# Altium schematic symbol library Resistor - Current Sense.SchLib: 810 symbols (part 1 of 4) (continued)
## CSNL2512FTL500 (continued)
RES SMD 0.0005 OHM 1% 2W 2512; Manufacturer: Stackpole Electronics Inc.; Value: 0.0005; TemperatureRange: -55C ~ 170C; TemperatureCoefficient: 50ppm/C; Part Number: CSNL2512FTL500; PartId: 21422; Supplier 1: Digi-Key; Supplier Part Number 1: CSNL2512FTL500TR-ND; ComponentLink1Description: Datasheet; ComponentLink1URL: https://www.seielect.com/Catalog/SEI-csnl.pdf; ComponentLink2Description: Digi-Key Listing; ComponentLink2URL: https://www.digikey.com/product-detail/en/stackpole-electronics-inc/CSNL2512FTL500/CSNL2512FTL500TR-ND/1788105; Tolerance: 1%; PowerRating: 2W; Price: 0.2261; Device Package: 2512 (6432 Metric)
footprint STACKPOLE CSR2512
pins: 1, 2

## CSR0402FK1R00
designator R?, comment 1
RES SMD 1 OHM 1% 1/8W 0402; Part Number: CSR0402FK1R00; Manufacturer: Stackpole Electronics Inc.; TemperatureRange: -55C ~ 155C; TemperatureCoefficient: 200ppm/C; PowerRating: 0.125W, 1/8W; Value: 1; PartId: 9835; Supplier 1: Digi-Key; Supplier Part Number 1: CSR0402FK1R00TR-ND; ComponentLink1Description: Datasheet; ComponentLink1URL: http://www.seielect.com/catalog/SEI-CSR_CSRN.pdf; ComponentLink2Description: Digi-Key Listing; ComponentLink2URL: https://www.digikey.com/product-detail/en/stackpole-electronics-inc/CSR0402FK1R00/CSR0402FK1R00TR-ND/1742501; Tolerance: 1%; Price: 0.036; Device Package: 0402 (1005 Metric)
footprint STACKPOLE CSR0402
pins: 1, 2

## CSR0402FK50L0
designator R?, comment 0.05
RES SMD 0.05 OHM 1% 1/8W 0402; Part Number: CSR0402FK50L0; Manufacturer: Stackpole Electronics Inc.; TemperatureRange: -55C ~ 155C; TemperatureCoefficient: 200ppm/C; PowerRating: 0.125W, 1/8W; Value: 0.05; PartId: 9834; Supplier 1: Digi-Key; Supplier Part Number 1: CSR0402FK50L0TR-ND; ComponentLink1Description: Datasheet; ComponentLink1URL: http://www.seielect.com/catalog/SEI-CSR_CSRN.pdf; ComponentLink2Description: Digi-Key Listing; ComponentLink2URL: https://www.digikey.com/product-detail/en/stackpole-electronics-inc/CSR0402FK50L0/CSR0402FK50L0TR-ND/5251277; Tolerance: 1%; Price: 0.08; Device Package: 0402 (1005 Metric)
footprint STACKPOLE CSR0402
pins: 1, 2

## CSR0402FK51L0
designator R?, comment 0.051
RES SMD 0.051 OHM 1% 1/8W 0402; Part Number: CSR0402FK51L0; Manufacturer: Stackpole Electronics Inc.; TemperatureRange: -55C ~ 155C; TemperatureCoefficient: 200ppm/C; PowerRating: 0.125W, 1/8W; Value: 0.051; PartId: 9843; Supplier 1: Digi-Key; Supplier Part Number 1: CSR0402FK51L0-ND; ComponentLink1Description: Datasheet; ComponentLink1URL: http://www.seielect.com/catalog/SEI-CSR_CSRN.pdf; ComponentLink2Description: Digi-Key Listing; ComponentLink2URL: https://www.digikey.com/product-detail/en/stackpole-electronics-inc/CSR0402FK51L0/CSR0402FK51L0-ND/1742495; Tolerance: 1%; Price: 0.08; Device Package: 0402 (1005 Metric)
footprint STACKPOLE CSR0402
pins: 1, 2

## CSR0402FK75L0
designator R?, comment 0.075
RES SMD 0.075 OHM 1% 1/8W 0402; Part Number: CSR0402FK75L0; Manufacturer: Stackpole Electronics Inc.; TemperatureRange: -55C ~ 155C; TemperatureCoefficient: 200ppm/C; PowerRating: 0.125W, 1/8W; Value: 0.075; PartId: 9833; Supplier 1: Digi-Key; Supplier Part Number 1: CSR0402FK75L0TR-ND; ComponentLink1Description: Datasheet; ComponentLink1URL: http://www.seielect.com/catalog/SEI-CSR_CSRN.pdf; ComponentLink2Description: Digi-Key Listing; ComponentLink2URL: https://www.digikey.com/product-detail/en/stackpole-electronics-inc/CSR0402FK75L0/CSR0402FK75L0TR-ND/5251278; Tolerance: 1%; Price: 0.08; Device Package: 0402 (1005 Metric)
footprint STACKPOLE CSR0402
pins: 1, 2

## CSR0402FKR100
designator R?, comment 0.1
RES SMD 0.1 OHM 1% 1/8W 0402; Part Number: CSR0402FKR100; Manufacturer: Stackpole Electronics Inc.; TemperatureRange: -55C ~ 155C; TemperatureCoefficient: 200ppm/C; PowerRating: 0.125W, 1/8W; Value: 0.1; PartId: 9838; Supplier 1: Digi-Key; Supplier Part Number 1: CSR0402FKR100TR-ND; ComponentLink1Description: Datasheet; ComponentLink1URL: http://www.seielect.com/catalog/SEI-CSR_CSRN.pdf; ComponentLink2Description: Digi-Key Listing; ComponentLink2URL: https://www.digikey.com/product-detail/en/stackpole-electronics-inc/CSR0402FKR100/CSR0402FKR100TR-ND/1742496; Tolerance: 1%; Price: 0.064; Device Package: 0402 (1005 Metric)
footprint STACKPOLE CSR0402
pins: 1, 2

## CSR0402FKR130
designator R?, comment 0.13
RES SMD 0.13 OHM 1% 1/8W 0402; Part Number: CSR0402FKR130; Manufacturer: Stackpole Electronics Inc.; TemperatureRange: -55C ~ 155C; TemperatureCoefficient: 200ppm/C; PowerRating: 0.125W, 1/8W; Value: 0.13; PartId: 9841; Supplier 1: Digi-Key; Supplier Part Number 1: CSR0402FKR130-ND; ComponentLink1Description: Datasheet; ComponentLink1URL: http://www.seielect.com/catalog/SEI-CSR_CSRN.pdf; ComponentLink2Description: Digi-Key Listing; ComponentLink2URL: https://www.digikey.com/product-detail/en/stackpole-electronics-inc/CSR0402FKR130/CSR0402FKR130-ND/1742498; Tolerance: 1%; Price: 0.036; Device Package: 0402 (1005 Metric)
footprint STACKPOLE CSR0402
pins: 1, 2

## CSR0402FKR200
designator R?, comment 0.2
RES SMD 0.2 OHM 1% 1/8W 0402; Part Number: CSR0402FKR200; Manufacturer: Stackpole Electronics Inc.; TemperatureRange: -55C ~ 155C; TemperatureCoefficient: 200ppm/C; PowerRating: 0.125W, 1/8W; Value: 0.2; PartId: 9832; Supplier 1: Digi-Key; Supplier Part Number 1: CSR0402FKR200TR-ND; ComponentLink1Description: Datasheet; ComponentLink1URL: http://www.seielect.com/catalog/SEI-CSR_CSRN.pdf; ComponentLink2Description: Digi-Key Listing; ComponentLink2URL: https://www.digikey.com/product-detail/en/stackpole-electronics-inc/CSR0402FKR200/CSR0402FKR200TR-ND/5251279; Tolerance: 1%; Price: 0.064; Device Package: 0402 (1005 Metric)
footprint STACKPOLE CSR0402
pins: 1, 2

## CSR0402FKR250
designator R?, comment 0.25
RES SMD 0.25 OHM 1% 1/8W 0402; Part Number: CSR0402FKR250; Manufacturer: Stackpole Electronics Inc.; TemperatureRange: -55C ~ 155C; TemperatureCoefficient: 200ppm/C; PowerRating: 0.125W, 1/8W; Value: 0.25; PartId: 9836; Supplier 1: Digi-Key; Supplier Part Number 1: CSR0402FKR250TR-ND; ComponentLink1Description: Datasheet; ComponentLink1URL: http://www.seielect.com/catalog/SEI-CSR_CSRN.pdf; ComponentLink2Description: Digi-Key Listing; ComponentLink2URL: https://www.digikey.com/product-detail/en/stackpole-electronics-inc/CSR0402FKR250/CSR0402FKR250TR-ND/5251280; Tolerance: 1%; Price: 0.064; Device Package: 0402 (1005 Metric)
footprint STACKPOLE CSR0402
pins: 1, 2

## CSR0402FKR300
designator R?, comment 0.3
RES SMD 0.3 OHM 1% 1/8W 0402; Part Number: CSR0402FKR300; Manufacturer: Stackpole Electronics Inc.; TemperatureRange: -55C ~ 155C; TemperatureCoefficient: 200ppm/C; PowerRating: 0.125W, 1/8W; Value: 0.3; PartId: 9831; Supplier 1: Digi-Key; Supplier Part Number 1: CSR0402FKR300TR-ND; ComponentLink1Description: Datasheet; ComponentLink1URL: http://www.seielect.com/catalog/SEI-CSR_CSRN.pdf; ComponentLink2Description: Digi-Key Listing; ComponentLink2URL: https://www.digikey.com/product-detail/en/stackpole-electronics-inc/CSR0402FKR300/CSR0402FKR300TR-ND/5251281; Tolerance: 1%; Price: 0.064; Device Package: 0402 (1005 Metric)
footprint STACKPOLE CSR0402
pins: 1, 2

## CSR0402FKR500
designator R?, comment 0.5
RES SMD 0.5 OHM 1% 1/8W 0402; Part Number: CSR0402FKR500; Manufacturer: Stackpole Electronics Inc.; TemperatureRange: -55C ~ 155C; TemperatureCoefficient: 200ppm/C; PowerRating: 0.125W, 1/8W; Value: 0.5; PartId: 9837; Supplier 1: Digi-Key; Supplier Part Number 1: CSR0402FKR500TR-ND; ComponentLink1Description: Datasheet; ComponentLink1URL: http://www.seielect.com/catalog/SEI-CSR_CSRN.pdf; ComponentLink2Description: Digi-Key Listing; ComponentLink2URL: https://www.digikey.com/product-detail/en/stackpole-electronics-inc/CSR0402FKR500/CSR0402FKR500TR-ND/5251282; Tolerance: 1%; Price: 0.036; Device Package: 0402 (1005 Metric)
footprint STACKPOLE CSR0402
pins: 1, 2

## CSR0402FTR100
designator R?, comment 0.1
RES SMD 0.1 OHM 1% 1/8W 0402; Part Number: CSR0402FTR100; Manufacturer: Stackpole Electronics Inc.; TemperatureRange: -55C ~ 155C; TemperatureCoefficient: 200ppm/C; PowerRating: 0.125W, 1/8W; Value: 0.1; PartId: 9842; Supplier 1: Digi-Key; Supplier Part Number 1: CSR0402FTR100-ND; ComponentLink1Description: Datasheet; ComponentLink1URL: http://www.seielect.com/catalog/SEI-CSR_CSRN.pdf; ComponentLink2Description: Digi-Key Listing; ComponentLink2URL: https://www.digikey.com/product-detail/en/stackpole-electronics-inc/CSR0402FTR100/CSR0402FTR100-ND/1742497; Tolerance: 1%; Price: 0.066; Device Package: 0402 (1005 Metric)
footprint STACKPOLE CSR0402
pins: 1, 2

## CSR0402FTR510
designator R?, comment 0.51
RES SMD 0.51 OHM 1% 1/8W 0402; Part Number: CSR0402FTR510; Manufacturer: Stackpole Electronics Inc.; TemperatureRange: -55C ~ 155C; TemperatureCoefficient: 200ppm/C; PowerRating: 0.125W, 1/8W; Value: 0.51; PartId: 9840; Supplier 1: Digi-Key; Supplier Part Number 1: CSR0402FTR510-ND; ComponentLink1Description: Datasheet; ComponentLink1URL: http://www.seielect.com/catalog/SEI-CSR_CSRN.pdf; ComponentLink2Description: Digi-Key Listing; ComponentLink2URL: https://www.digikey.com/product-detail/en/stackpole-electronics-inc/CSR0402FTR510/CSR0402FTR510-ND/1742500; Tolerance: 1%; Price: 0.028; Device Package: 0402 (1005 Metric)
footprint STACKPOLE CSR0402
pins: 1, 2

## CSR0402JKR500
designator R?, comment 0.5
RES SMD 0.5 OHM 5% 1/8W 0402; Part Number: CSR0402JKR500; Manufacturer: Stackpole Electronics Inc.; TemperatureRange: -55C ~ 155C; TemperatureCoefficient: 200ppm/C; PowerRating: 0.125W, 1/8W; Value: 0.5; PartId: 9839; Supplier 1: Digi-Key; Supplier Part Number 1: CSR0402JKR500-ND; ComponentLink1Description: Datasheet; ComponentLink1URL: http://www.seielect.com/catalog/SEI-CSR_CSRN.pdf; ComponentLink2Description: Digi-Key Listing; ComponentLink2URL: https://www.digikey.com/product-detail/en/stackpole-electronics-inc/CSR0402JKR500/CSR0402JKR500-ND/1742499; Tolerance: 5%; Price: 0.027; Device Package: 0402 (1005 Metric)
footprint STACKPOLE CSR0402
pins: 1, 2

## CSR0603FK1R00
designator R?, comment 1
RES SMD 1 OHM 1% 1/8W 0603; Part Number: CSR0603FK1R00; Manufacturer: Stackpole Electronics Inc.; TemperatureRange: -55C ~ 155C; TemperatureCoefficient: 300ppm/C; PowerRating: 0.125W, 1/8W; Value: 1; PartId: 9854; Supplier 1: Digi-Key; Supplier Part Number 1: CSR0603FK1R00TR-ND; ComponentLink1Description: Datasheet; ComponentLink1URL: http://www.seielect.com/catalog/SEI-CSR_CSRN.pdf; ComponentLink2Description: Digi-Key Listing; ComponentLink2URL: https://www.digikey.com/product-detail/en/stackpole-electronics-inc/CSR0603FK1R00/CSR0603FK1R00TR-ND/2217462; Tolerance: 1%; Price: 0.036; Device Package: 0603 (1608 Metric)
footprint STACKPOLE CSR0603
pins: 1, 2

## CSR0603FK20L0
designator R?, comment 0.02
RES SMD 0.02 OHM 1% 1/8W 0603; Part Number: CSR0603FK20L0; Manufacturer: Stackpole Electronics Inc.; TemperatureRange: -55C ~ 155C; TemperatureCoefficient: 300ppm/C; PowerRating: 0.125W, 1/8W; Value: 0.02; PartId: 9853; Supplier 1: Digi-Key; Supplier Part Number 1: CSR0603FK20L0TR-ND; ComponentLink1Description: Datasheet; ComponentLink1URL: http://www.seielect.com/catalog/SEI-CSR_CSRN.pdf; ComponentLink2Description: Digi-Key Listing; ComponentLink2URL: https://www.digikey.com/product-detail/en/stackpole-electronics-inc/CSR0603FK20L0/CSR0603FK20L0TR-ND/1742472; Tolerance: 1%; Price: 0.112; Device Package: 0603 (1608 Metric)
footprint STACKPOLE CSR0603
pins: 1, 2

## CSR0603FK25L0
designator R?, comment 0.025
RES SMD 0.025 OHM 1% 1/8W 0603; Part Number: CSR0603FK25L0; Manufacturer: Stackpole Electronics Inc.; TemperatureRange: -55C ~ 155C; TemperatureCoefficient: 300ppm/C; PowerRating: 0.125W, 1/8W; Value: 0.025; PartId: 9849; Supplier 1: Digi-Key; Supplier Part Number 1: CSR0603FK25L0TR-ND; ComponentLink1Description: Datasheet; ComponentLink1URL: http://www.seielect.com/catalog/SEI-CSR_CSRN.pdf; ComponentLink2Description: Digi-Key Listing; ComponentLink2URL: https://www.digikey.com/product-detail/en/stackpole-electronics-inc/CSR0603FK25L0/CSR0603FK25L0TR-ND/1742473; Tolerance: 1%; Price: 0.112; Device Package: 0603 (1608 Metric)
footprint STACKPOLE CSR0603
pins: 1, 2

## CSR0603FK30L0
designator R?, comment 0.03
RES SMD 0.03 OHM 1% 1/8W 0603; Part Number: CSR0603FK30L0; Manufacturer: Stackpole Electronics Inc.; TemperatureRange: -55C ~ 155C; TemperatureCoefficient: 300ppm/C; PowerRating: 0.125W, 1/8W; Value: 0.03; PartId: 9850; Supplier 1: Digi-Key; Supplier Part Number 1: CSR0603FK30L0TR-ND; ComponentLink1Description: Datasheet; ComponentLink1URL: http://www.seielect.com/catalog/SEI-CSR_CSRN.pdf; ComponentLink2Description: Digi-Key Listing; ComponentLink2URL: https://www.digikey.com/product-detail/en/stackpole-electronics-inc/CSR0603FK30L0/CSR0603FK30L0TR-ND/2217457; Tolerance: 1%; Price: 0.112; Device Package: 0603 (1608 Metric)
footprint STACKPOLE CSR0603
pins: 1, 2

## CSR0603FK50L0
designator R?, comment 0.05
RES SMD 0.05 OHM 1% 1/8W 0603; Part Number: CSR0603FK50L0; Manufacturer: Stackpole Electronics Inc.; TemperatureRange: -55C ~ 155C; TemperatureCoefficient: 300ppm/C; PowerRating: 0.125W, 1/8W; Value: 0.05; PartId: 9848; Supplier 1: Digi-Key; Supplier Part Number 1: CSR0603FK50L0TR-ND; ComponentLink1Description: Datasheet; ComponentLink1URL: http://www.seielect.com/catalog/SEI-CSR_CSRN.pdf; ComponentLink2Description: Digi-Key Listing; ComponentLink2URL: https://www.digikey.com/product-detail/en/stackpole-electronics-inc/CSR0603FK50L0/CSR0603FK50L0TR-ND/2217458; Tolerance: 1%; Price: 0.096; Device Package: 0603 (1608 Metric)
footprint STACKPOLE CSR0603
pins: 1, 2

## CSR0603FK75L0
designator R?, comment 0.075
RES SMD 0.075 OHM 1% 1/8W 0603; Part Number: CSR0603FK75L0; Manufacturer: Stackpole Electronics Inc.; TemperatureRange: -55C ~ 155C; TemperatureCoefficient: 300ppm/C; PowerRating: 0.125W, 1/8W; Value: 0.075; PartId: 9851; Supplier 1: Digi-Key; Supplier Part Number 1: CSR0603FK75L0TR-ND; ComponentLink1Description: Datasheet; ComponentLink1URL: http://www.seielect.com/catalog/SEI-CSR_CSRN.pdf; ComponentLink2Description: Digi-Key Listing; ComponentLink2URL: https://www.digikey.com/product-detail/en/stackpole-electronics-inc/CSR0603FK75L0/CSR0603FK75L0TR-ND/1742480; Tolerance: 1%; Price: 0.096; Device Package: 0603 (1608 Metric)
footprint STACKPOLE CSR0603
pins: 1, 2

## CSR0603FKR100
designator R?, comment 0.1
RES SMD 0.1 OHM 1% 1/8W 0603; Part Number: CSR0603FKR100; Manufacturer: Stackpole Electronics Inc.; TemperatureRange: -55C ~ 155C; TemperatureCoefficient: 300ppm/C; PowerRating: 0.125W, 1/8W; Value: 0.1; PartId: 9847; Supplier 1: Digi-Key; Supplier Part Number 1: CSR0603FKR100TR-ND; ComponentLink1Description: Datasheet; ComponentLink1URL: http://www.seielect.com/catalog/SEI-CSR_CSRN.pdf; ComponentLink2Description: Digi-Key Listing; ComponentLink2URL: https://www.digikey.com/product-detail/en/stackpole-electronics-inc/CSR0603FKR100/CSR0603FKR100TR-ND/2217459; Tolerance: 1%; Price: 0.064; Device Package: 0603 (1608 Metric)
footprint STACKPOLE CSR0603
pins: 1, 2

## CSR0603FKR150
designator R?, comment 0.15
RES SMD 0.15 OHM 1% 1/8W 0603; Part Number: CSR0603FKR150; Manufacturer: Stackpole Electronics Inc.; TemperatureRange: -55C ~ 155C; TemperatureCoefficient: 300ppm/C; PowerRating: 0.125W, 1/8W; Value: 0.15; PartId: 9866; Supplier 1: Digi-Key; Supplier Part Number 1: CSR0603FKR150-ND; ComponentLink1Description: Datasheet; ComponentLink1URL: http://www.seielect.com/catalog/SEI-CSR_CSRN.pdf; ComponentLink2Description: Digi-Key Listing; ComponentLink2URL: https://www.digikey.com/product-detail/en/stackpole-electronics-inc/CSR0603FKR150/CSR0603FKR150-ND/1742483; Tolerance: 1%; Price: 0.064; Device Package: 0603 (1608 Metric)
footprint STACKPOLE CSR0603
pins: 1, 2

## CSR0603FKR200
designator R?, comment 0.2
RES SMD 0.2 OHM 1% 1/8W 0603; Part Number: CSR0603FKR200; Manufacturer: Stackpole Electronics Inc.; TemperatureRange: -55C ~ 155C; TemperatureCoefficient: 300ppm/C; PowerRating: 0.125W, 1/8W; Value: 0.2; PartId: 9845; Supplier 1: Digi-Key; Supplier Part Number 1: CSR0603FKR200TR-ND; ComponentLink1Description: Datasheet; ComponentLink1URL: http://www.seielect.com/catalog/SEI-CSR_CSRN.pdf; ComponentLink2Description: Digi-Key Listing; ComponentLink2URL: https://www.digikey.com/product-detail/en/stackpole-electronics-inc/CSR0603FKR200/CSR0603FKR200TR-ND/1742484; Tolerance: 1%; Price: 0.064; Device Package: 0603 (1608 Metric)
footprint STACKPOLE CSR0603
pins: 1, 2

## CSR0603FKR220
designator R?, comment 0.22
RES SMD 0.22 OHM 1% 1/8W 0603; Part Number: CSR0603FKR220; Manufacturer: Stackpole Electronics Inc.; TemperatureRange: -55C ~ 155C; TemperatureCoefficient: 300ppm/C; PowerRating: 0.125W, 1/8W; Value: 0.22; PartId: 9867; Supplier 1: Digi-Key; Supplier Part Number 1: CSR0603FKR220-ND; ComponentLink1Description: Datasheet; ComponentLink1URL: http://www.seielect.com/catalog/SEI-CSR_CSRN.pdf; ComponentLink2Description: Digi-Key Listing; ComponentLink2URL: https://www.digikey.com/product-detail/en/stackpole-electronics-inc/CSR0603FKR220/CSR0603FKR220-ND/1742485; Tolerance: 1%; Price: 0.064; Device Package: 0603 (1608 Metric)
footprint STACKPOLE CSR0603
pins: 1, 2

## CSR0603FKR250
designator R?, comment 0.25
RES SMD 0.25 OHM 1% 1/8W 0603; Part Number: CSR0603FKR250; Manufacturer: Stackpole Electronics Inc.; TemperatureRange: -55C ~ 155C; TemperatureCoefficient: 300ppm/C; PowerRating: 0.125W, 1/8W; Value: 0.25; PartId: 9846; Supplier 1: Digi-Key; Supplier Part Number 1: CSR0603FKR250TR-ND; ComponentLink1Description: Datasheet; ComponentLink1URL: http://www.seielect.com/catalog/SEI-CSR_CSRN.pdf; ComponentLink2Description: Digi-Key Listing; ComponentLink2URL: https://www.digikey.com/product-detail/en/stackpole-electronics-inc/CSR0603FKR250/CSR0603FKR250TR-ND/1742486; Tolerance: 1%; Price: 0.064; Device Package: 0603 (1608 Metric)
footprint STACKPOLE CSR0603
pins: 1, 2

## CSR0603FKR300
designator R?, comment 0.3
RES SMD 0.3 OHM 1% 1/8W 0603; Part Number: CSR0603FKR300; Manufacturer: Stackpole Electronics Inc.; TemperatureRange: -55C ~ 155C; TemperatureCoefficient: 300ppm/C; PowerRating: 0.125W, 1/8W; Value: 0.3; PartId: 9852; Supplier 1: Digi-Key; Supplier Part Number 1: CSR0603FKR300TR-ND; ComponentLink1Description: Datasheet; ComponentLink1URL: http://www.seielect.com/catalog/SEI-CSR_CSRN.pdf; ComponentLink2Description: Digi-Key Listing; ComponentLink2URL: https://www.digikey.com/product-detail/en/stackpole-electronics-inc/CSR0603FKR300/CSR0603FKR300TR-ND/2217460; Tolerance: 1%; Price: 0.064; Device Package: 0603 (1608 Metric)
footprint STACKPOLE CSR0603
pins: 1, 2

## CSR0603FKR500
designator R?, comment 0.5
RES SMD 0.5 OHM 1% 1/8W 0603; Part Number: CSR0603FKR500; Manufacturer: Stackpole Electronics Inc.; TemperatureRange: -55C ~ 155C; TemperatureCoefficient: 300ppm/C; PowerRating: 0.125W, 1/8W; Value: 0.5; PartId: 9844; Supplier 1: Digi-Key; Supplier Part Number 1: CSR0603FKR500TR-ND; ComponentLink1Description: Datasheet; ComponentLink1URL: http://www.seielect.com/catalog/SEI-CSR_CSRN.pdf; ComponentLink2Description: Digi-Key Listing; ComponentLink2URL: https://www.digikey.com/product-detail/en/stackpole-electronics-inc/CSR0603FKR500/CSR0603FKR500TR-ND/2217461; Tolerance: 1%; Price: 0.036; Device Package: 0603 (1608 Metric)
footprint STACKPOLE CSR0603
pins: 1, 2

## CSR0603FKR750
designator R?, comment 0.75
RES SMD 0.75 OHM 1% 1/8W 0603; Part Number: CSR0603FKR750; Manufacturer: Stackpole Electronics Inc.; TemperatureRange: -55C ~ 155C; TemperatureCoefficient: 300ppm/C; PowerRating: 0.125W, 1/8W; Value: 0.75; PartId: 9861; Supplier 1: Digi-Key; Supplier Part Number 1: CSR0603FKR750-ND; ComponentLink1Description: Datasheet; ComponentLink1URL: http://www.seielect.com/catalog/SEI-CSR_CSRN.pdf; ComponentLink2Description: Digi-Key Listing; ComponentLink2URL: https://www.digikey.com/product-detail/en/stackpole-electronics-inc/CSR0603FKR750/CSR0603FKR750-ND/1742492; Tolerance: 1%; Price: 0.036; Device Package: 0603 (1608 Metric)
footprint STACKPOLE CSR0603
pins: 1, 2

## CSR0603FT25L0
designator R?, comment 0.025
RES SMD 0.025 OHM 1% 1/8W 0603; Part Number: CSR0603FT25L0; Manufacturer: Stackpole Electronics Inc.; TemperatureRange: -55C ~ 155C; TemperatureCoefficient: 300ppm/C; PowerRating: 0.125W, 1/8W; Value: 0.025; PartId: 9872; Supplier 1: Digi-Key; Supplier Part Number 1: CSR0603FT25L0-ND; ComponentLink1Description: Datasheet; ComponentLink1URL: http://www.seielect.com/catalog/SEI-CSR_CSRN.pdf; ComponentLink2Description: Digi-Key Listing; ComponentLink2URL: https://www.digikey.com/product-detail/en/stackpole-electronics-inc/CSR0603FT25L0/CSR0603FT25L0-ND/1742474; Tolerance: 1%; Price: 0.1064; Device Package: 0603 (1608 Metric)
footprint STACKPOLE CSR0603
pins: 1, 2

## CSR0603FT75L0
designator R?, comment 0.075
RES SMD 0.075 OHM 1% 1/8W 0603; Part Number: CSR0603FT75L0; Manufacturer: Stackpole Electronics Inc.; TemperatureRange: -55C ~ 155C; TemperatureCoefficient: 300ppm/C; PowerRating: 0.125W, 1/8W; Value: 0.075; PartId: 9869; Supplier 1: Digi-Key; Supplier Part Number 1: CSR0603FT75L0-ND; ComponentLink1Description: Datasheet; ComponentLink1URL: http://www.seielect.com/catalog/SEI-CSR_CSRN.pdf; ComponentLink2Description: Digi-Key Listing; ComponentLink2URL: https://www.digikey.com/product-detail/en/stackpole-electronics-inc/CSR0603FT75L0/CSR0603FT75L0-ND/1742481; Tolerance: 1%; Price: 0.081; Device Package: 0603 (1608 Metric)
footprint STACKPOLE CSR0603
pins: 1, 2

## CSR0603FTR250
designator R?, comment 0.25
RES SMD 0.25 OHM 1% 1/8W 0603; Part Number: CSR0603FTR250; Manufacturer: Stackpole Electronics Inc.; TemperatureRange: -55C ~ 155C; TemperatureCoefficient: 300ppm/C; PowerRating: 0.125W, 1/8W; Value: 0.25; PartId: 9863; Supplier 1: Digi-Key; Supplier Part Number 1: CSR0603FTR250-ND; ComponentLink1Description: Datasheet; ComponentLink1URL: http://www.seielect.com/catalog/SEI-CSR_CSRN.pdf; ComponentLink2Description: Digi-Key Listing; ComponentLink2URL: https://www.digikey.com/product-detail/en/stackpole-electronics-inc/CSR0603FTR250/CSR0603FTR250-ND/1742487; Tolerance: 1%; Price: 0.054; Device Package: 0603 (1608 Metric)
footprint STACKPOLE CSR0603
pins: 1, 2

## CSR0603FTR750
designator R?, comment 0.75
RES SMD 0.75 OHM 1% 1/8W 0603; Part Number: CSR0603FTR750; Manufacturer: Stackpole Electronics Inc.; TemperatureRange: -55C ~ 155C; TemperatureCoefficient: 300ppm/C; PowerRating: 0.125W, 1/8W; Value: 0.75; PartId: 9860; Supplier 1: Digi-Key; Supplier Part Number 1: CSR0603FTR750-ND; ComponentLink1Description: Datasheet; ComponentLink1URL: http://www.seielect.com/catalog/SEI-CSR_CSRN.pdf; ComponentLink2Description: Digi-Key Listing; ComponentLink2URL: https://www.digikey.com/product-detail/en/stackpole-electronics-inc/CSR0603FTR750/CSR0603FTR750-ND/1742493; Tolerance: 1%; Price: 0.03; Device Package: 0603 (1608 Metric)
footprint STACKPOLE CSR0603
pins: 1, 2

## CSR0603JK25L0
designator R?, comment 0.025
RES SMD 0.025 OHM 5% 1/8W 0603; Part Number: CSR0603JK25L0; Manufacturer: Stackpole Electronics Inc.; TemperatureRange: -55C ~ 155C; TemperatureCoefficient: 300ppm/C; PowerRating: 0.125W, 1/8W; Value: 0.025; PartId: 9870; Supplier 1: Digi-Key; Supplier Part Number 1: CSR0603JK25L0-ND; ComponentLink1Description: Datasheet; ComponentLink1URL: http://www.seielect.com/catalog/SEI-CSR_CSRN.pdf; ComponentLink2Description: Digi-Key Listing; ComponentLink2URL: https://www.digikey.com/product-detail/en/stackpole-electronics-inc/CSR0603JK25L0/CSR0603JK25L0-ND/1742475; Tolerance: 5%; Price: 0.096; Device Package: 0603 (1608 Metric)
footprint STACKPOLE CSR0603
pins: 1, 2

## CSR0603JK33L0
designator R?, comment 0.033
RES SMD 0.033 OHM 5% 1/8W 0603; Part Number: CSR0603JK33L0; Manufacturer: Stackpole Electronics Inc.; TemperatureRange: -55C ~ 155C; TemperatureCoefficient: 300ppm/C; PowerRating: 0.125W, 1/8W; Value: 0.033; PartId: 9871; Supplier 1: Digi-Key; Supplier Part Number 1: CSR0603JK33L0-ND; ComponentLink1Description: Datasheet; ComponentLink1URL: http://www.seielect.com/catalog/SEI-CSR_CSRN.pdf; ComponentLink2Description: Digi-Key Listing; ComponentLink2URL: https://www.digikey.com/product-detail/en/stackpole-electronics-inc/CSR0603JK33L0/CSR0603JK33L0-ND/1742476; Tolerance: 5%; Price: 0.096; Device Package: 0603 (1608 Metric)
footprint STACKPOLE CSR0603
pins: 1, 2

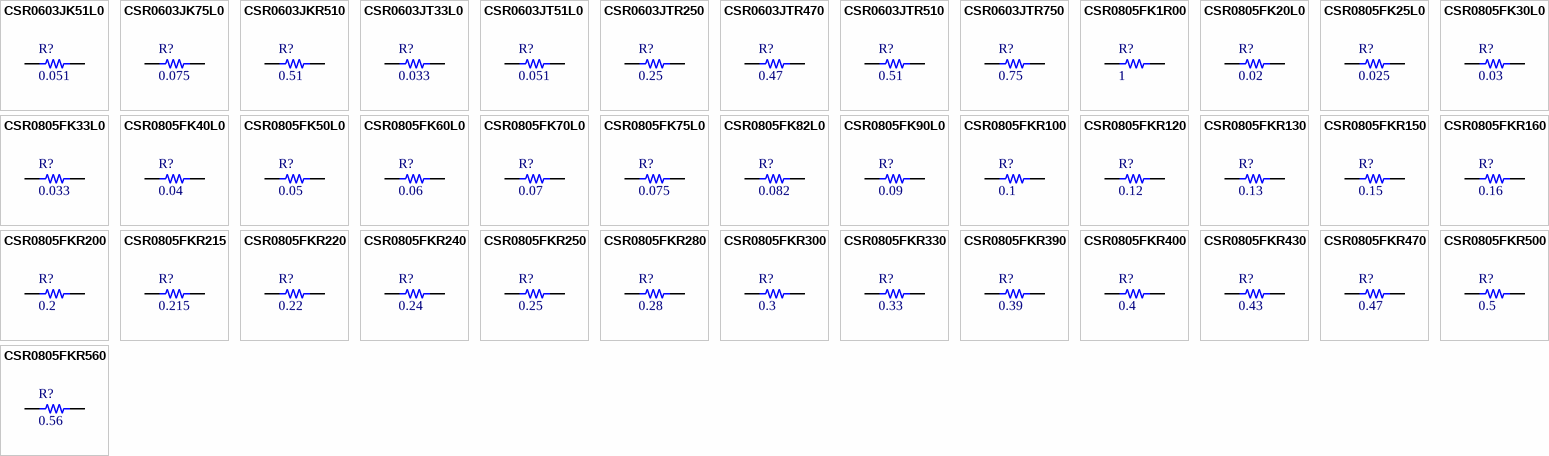
[diagram p2: symbols CSR0603JK51L0 to CSR0805FKR560]

## CSR0603JK51L0
designator R?, comment 0.051
RES SMD 0.051 OHM 5% 1/8W 0603; Part Number: CSR0603JK51L0; Manufacturer: Stackpole Electronics Inc.; TemperatureRange: -55C ~ 155C; TemperatureCoefficient: 300ppm/C; PowerRating: 0.125W, 1/8W; Value: 0.051; PartId: 9864; Supplier 1: Digi-Key; Supplier Part Number 1: CSR0603JK51L0-ND; ComponentLink1Description: Datasheet; ComponentLink1URL: http://www.seielect.com/catalog/SEI-CSR_CSRN.pdf; ComponentLink2Description: Digi-Key Listing; ComponentLink2URL: https://www.digikey.com/product-detail/en/stackpole-electronics-inc/CSR0603JK51L0/CSR0603JK51L0-ND/1742478; Tolerance: 5%; Price: 0.064; Device Package: 0603 (1608 Metric)
footprint STACKPOLE CSR0603
pins: 1, 2

## CSR0603JK75L0
designator R?, comment 0.075
RES SMD 0.075 OHM 5% 1/8W 0603; Part Number: CSR0603JK75L0; Manufacturer: Stackpole Electronics Inc.; TemperatureRange: -55C ~ 155C; TemperatureCoefficient: 300ppm/C; PowerRating: 0.125W, 1/8W; Value: 0.075; PartId: 9865; Supplier 1: Digi-Key; Supplier Part Number 1: CSR0603JK75L0-ND; ComponentLink1Description: Datasheet; ComponentLink1URL: http://www.seielect.com/catalog/SEI-CSR_CSRN.pdf; ComponentLink2Description: Digi-Key Listing; ComponentLink2URL: https://www.digikey.com/product-detail/en/stackpole-electronics-inc/CSR0603JK75L0/CSR0603JK75L0-ND/1742482; Tolerance: 5%; Price: 0.064; Device Package: 0603 (1608 Metric)
footprint STACKPOLE CSR0603
pins: 1, 2

## CSR0603JKR510
designator R?, comment 0.51
RES SMD 0.51 OHM 5% 1/8W 0603; Part Number: CSR0603JKR510; Manufacturer: Stackpole Electronics Inc.; TemperatureRange: -55C ~ 155C; TemperatureCoefficient: 300ppm/C; PowerRating: 0.125W, 1/8W; Value: 0.51; PartId: 9857; Supplier 1: Digi-Key; Supplier Part Number 1: CSR0603JKR510-ND; ComponentLink1Description: Datasheet; ComponentLink1URL: http://www.seielect.com/catalog/SEI-CSR_CSRN.pdf; ComponentLink2Description: Digi-Key Listing; ComponentLink2URL: https://www.digikey.com/product-detail/en/stackpole-electronics-inc/CSR0603JKR510/CSR0603JKR510-ND/1742490; Tolerance: 5%; Price: 0.018; Device Package: 0603 (1608 Metric)
footprint STACKPOLE CSR0603
pins: 1, 2

## CSR0603JT33L0
designator R?, comment 0.033
RES SMD 0.033 OHM 5% 1/8W 0603; Part Number: CSR0603JT33L0; Manufacturer: Stackpole Electronics Inc.; TemperatureRange: -55C ~ 155C; TemperatureCoefficient: 300ppm/C; PowerRating: 0.125W, 1/8W; Value: 0.033; PartId: 9868; Supplier 1: Digi-Key; Supplier Part Number 1: CSR0603JT33L0-ND; ComponentLink1Description: Datasheet; ComponentLink1URL: http://www.seielect.com/catalog/SEI-CSR_CSRN.pdf; ComponentLink2Description: Digi-Key Listing; ComponentLink2URL: https://www.digikey.com/product-detail/en/stackpole-electronics-inc/CSR0603JT33L0/CSR0603JT33L0-ND/1742477; Tolerance: 5%; Price: 0.081; Device Package: 0603 (1608 Metric)
footprint STACKPOLE CSR0603
pins: 1, 2

## CSR0603JT51L0
designator R?, comment 0.051
RES SMD 0.051 OHM 5% 1/8W 0603; Part Number: CSR0603JT51L0; Manufacturer: Stackpole Electronics Inc.; TemperatureRange: -55C ~ 155C; TemperatureCoefficient: 300ppm/C; PowerRating: 0.125W, 1/8W; Value: 0.051; PartId: 9862; Supplier 1: Digi-Key; Supplier Part Number 1: CSR0603JT51L0-ND; ComponentLink1Description: Datasheet; ComponentLink1URL: http://www.seielect.com/catalog/SEI-CSR_CSRN.pdf; ComponentLink2Description: Digi-Key Listing; ComponentLink2URL: https://www.digikey.com/product-detail/en/stackpole-electronics-inc/CSR0603JT51L0/CSR0603JT51L0-ND/1742479; Tolerance: 5%; Price: 0.054; Device Package: 0603 (1608 Metric)
footprint STACKPOLE CSR0603
pins: 1, 2

## CSR0603JTR250
designator R?, comment 0.25
RES SMD 0.25 OHM 5% 1/8W 0603; Part Number: CSR0603JTR250; Manufacturer: Stackpole Electronics Inc.; TemperatureRange: -55C ~ 155C; TemperatureCoefficient: 300ppm/C; PowerRating: 0.125W, 1/8W; Value: 0.25; PartId: 9858; Supplier 1: Digi-Key; Supplier Part Number 1: CSR0603JTR250-ND; ComponentLink1Description: Datasheet; ComponentLink1URL: http://www.seielect.com/catalog/SEI-CSR_CSRN.pdf; ComponentLink2Description: Digi-Key Listing; ComponentLink2URL: https://www.digikey.com/product-detail/en/stackpole-electronics-inc/CSR0603JTR250/CSR0603JTR250-ND/1742488; Tolerance: 5%; Price: 0.03; Device Package: 0603 (1608 Metric)
footprint STACKPOLE CSR0603
pins: 1, 2

## CSR0603JTR470
designator R?, comment 0.47
RES SMD 0.47 OHM 5% 1/8W 0603; Part Number: CSR0603JTR470; Manufacturer: Stackpole Electronics Inc.; TemperatureRange: -55C ~ 155C; TemperatureCoefficient: 300ppm/C; PowerRating: 0.125W, 1/8W; Value: 0.47; PartId: 9859; Supplier 1: Digi-Key; Supplier Part Number 1: CSR0603JTR470-ND; ComponentLink1Description: Datasheet; ComponentLink1URL: http://www.seielect.com/catalog/SEI-CSR_CSRN.pdf; ComponentLink2Description: Digi-Key Listing; ComponentLink2URL: https://www.digikey.com/product-detail/en/stackpole-electronics-inc/CSR0603JTR470/CSR0603JTR470-ND/1742489; Tolerance: 5%; Price: 0.03; Device Package: 0603 (1608 Metric)
footprint STACKPOLE CSR0603
pins: 1, 2

## CSR0603JTR510
designator R?, comment 0.51
RES SMD 0.51 OHM 5% 1/8W 0603; Part Number: CSR0603JTR510; Manufacturer: Stackpole Electronics Inc.; TemperatureRange: -55C ~ 155C; TemperatureCoefficient: 300ppm/C; PowerRating: 0.125W, 1/8W; Value: 0.51; PartId: 9855; Supplier 1: Digi-Key; Supplier Part Number 1: CSR0603JTR510-ND; ComponentLink1Description: Datasheet; ComponentLink1URL: http://www.seielect.com/catalog/SEI-CSR_CSRN.pdf; ComponentLink2Description: Digi-Key Listing; ComponentLink2URL: https://www.digikey.com/product-detail/en/stackpole-electronics-inc/CSR0603JTR510/CSR0603JTR510-ND/1742491; Tolerance: 5%; Price: 0.015; Device Package: 0603 (1608 Metric)
footprint STACKPOLE CSR0603
pins: 1, 2

## CSR0603JTR750
designator R?, comment 0.75
RES SMD 0.75 OHM 5% 1/8W 0603; Part Number: CSR0603JTR750; Manufacturer: Stackpole Electronics Inc.; TemperatureRange: -55C ~ 155C; TemperatureCoefficient: 300ppm/C; PowerRating: 0.125W, 1/8W; Value: 0.75; PartId: 9856; Supplier 1: Digi-Key; Supplier Part Number 1: CSR0603JTR750-ND; ComponentLink1Description: Datasheet; ComponentLink1URL: http://www.seielect.com/catalog/SEI-CSR_CSRN.pdf; ComponentLink2Description: Digi-Key Listing; ComponentLink2URL: https://www.digikey.com/product-detail/en/stackpole-electronics-inc/CSR0603JTR750/CSR0603JTR750-ND/1742494; Tolerance: 5%; Price: 0.015; Device Package: 0603 (1608 Metric)
footprint STACKPOLE CSR0603
pins: 1, 2

## CSR0805FK1R00
designator R?, comment 1
RES SMD 1 OHM 1% 1/4W 0805; Part Number: CSR0805FK1R00; Manufacturer: Stackpole Electronics Inc.; TemperatureRange: -55C ~ 155C; TemperatureCoefficient: 200ppm/C; PowerRating: 0.25W, 1/4W; Value: 1; PartId: 9879; Supplier 1: Digi-Key; Supplier Part Number 1: CSR0805FK1R00TR-ND; ComponentLink1Description: Datasheet; ComponentLink1URL: http://www.seielect.com/catalog/SEI-CSR_CSRN.pdf; ComponentLink2Description: Digi-Key Listing; ComponentLink2URL: https://www.digikey.com/product-detail/en/stackpole-electronics-inc/CSR0805FK1R00/CSR0805FK1R00TR-ND/2217466; Tolerance: 1%; Price: 0.036; Device Package: 0805 (2012 Metric)
footprint STACKPOLE CSR0805
pins: 1, 2

## CSR0805FK20L0
designator R?, comment 0.02
RES SMD 0.02 OHM 1% 1/4W 0805; Part Number: CSR0805FK20L0; Manufacturer: Stackpole Electronics Inc.; TemperatureRange: -55C ~ 155C; TemperatureCoefficient: 200ppm/C; PowerRating: 0.25W, 1/4W; Value: 0.02; PartId: 9883; Supplier 1: Digi-Key; Supplier Part Number 1: CSR0805FK20L0TR-ND; ComponentLink1Description: Datasheet; ComponentLink1URL: http://www.seielect.com/catalog/SEI-CSR_CSRN.pdf; ComponentLink2Description: Digi-Key Listing; ComponentLink2URL: https://www.digikey.com/product-detail/en/stackpole-electronics-inc/CSR0805FK20L0/CSR0805FK20L0TR-ND/2217463; Tolerance: 1%; Price: 0.112; Device Package: 0805 (2012 Metric)
footprint STACKPOLE CSR0805
pins: 1, 2

## CSR0805FK25L0
designator R?, comment 0.025
RES SMD 0.025 OHM 1% 1/4W 0805; Part Number: CSR0805FK25L0; Manufacturer: Stackpole Electronics Inc.; TemperatureRange: -55C ~ 155C; TemperatureCoefficient: 200ppm/C; PowerRating: 0.25W, 1/4W; Value: 0.025; PartId: 9875; Supplier 1: Digi-Key; Supplier Part Number 1: CSR0805FK25L0TR-ND; ComponentLink1Description: Datasheet; ComponentLink1URL: http://www.seielect.com/catalog/SEI-CSR_CSRN.pdf; ComponentLink2Description: Digi-Key Listing; ComponentLink2URL: https://www.digikey.com/product-detail/en/stackpole-electronics-inc/CSR0805FK25L0/CSR0805FK25L0TR-ND/1742412; Tolerance: 1%; Price: 0.112; Device Package: 0805 (2012 Metric)
footprint STACKPOLE CSR0805
pins: 1, 2

## CSR0805FK30L0
designator R?, comment 0.03
RES SMD 0.03 OHM 1% 1/4W 0805; Part Number: CSR0805FK30L0; Manufacturer: Stackpole Electronics Inc.; TemperatureRange: -55C ~ 155C; TemperatureCoefficient: 200ppm/C; PowerRating: 0.25W, 1/4W; Value: 0.03; PartId: 9878; Supplier 1: Digi-Key; Supplier Part Number 1: CSR0805FK30L0TR-ND; ComponentLink1Description: Datasheet; ComponentLink1URL: http://www.seielect.com/catalog/SEI-CSR_CSRN.pdf; ComponentLink2Description: Digi-Key Listing; ComponentLink2URL: https://www.digikey.com/product-detail/en/stackpole-electronics-inc/CSR0805FK30L0/CSR0805FK30L0TR-ND/2217464; Tolerance: 1%; Price: 0.112; Device Package: 0805 (2012 Metric)
footprint STACKPOLE CSR0805
pins: 1, 2

## CSR0805FK33L0
designator R?, comment 0.033
RES SMD 0.033 OHM 1% 1/4W 0805; Part Number: CSR0805FK33L0; Manufacturer: Stackpole Electronics Inc.; TemperatureRange: -55C ~ 155C; TemperatureCoefficient: 200ppm/C; PowerRating: 0.25W, 1/4W; Value: 0.033; PartId: 9921; Supplier 1: Digi-Key; Supplier Part Number 1: CSR0805FK33L0-ND; ComponentLink1Description: Datasheet; ComponentLink1URL: http://www.seielect.com/catalog/SEI-CSR_CSRN.pdf; ComponentLink2Description: Digi-Key Listing; ComponentLink2URL: https://www.digikey.com/product-detail/en/stackpole-electronics-inc/CSR0805FK33L0/CSR0805FK33L0-ND/1742414; Tolerance: 1%; Price: 0.112; Device Package: 0805 (2012 Metric)
footprint STACKPOLE CSR0805
pins: 1, 2

## CSR0805FK40L0
designator R?, comment 0.04
RES SMD 0.04 OHM 1% 1/4W 0805; Part Number: CSR0805FK40L0; Manufacturer: Stackpole Electronics Inc.; TemperatureRange: -55C ~ 155C; TemperatureCoefficient: 200ppm/C; PowerRating: 0.25W, 1/4W; Value: 0.04; PartId: 9922; Supplier 1: Digi-Key; Supplier Part Number 1: CSR0805FK40L0-ND; ComponentLink1Description: Datasheet; ComponentLink1URL: http://www.seielect.com/catalog/SEI-CSR_CSRN.pdf; ComponentLink2Description: Digi-Key Listing; ComponentLink2URL: https://www.digikey.com/product-detail/en/stackpole-electronics-inc/CSR0805FK40L0/CSR0805FK40L0-ND/1742416; Tolerance: 1%; Price: 0.112; Device Package: 0805 (2012 Metric)
footprint STACKPOLE CSR0805
pins: 1, 2

## CSR0805FK50L0
designator R?, comment 0.05